# Altium footprint library con-samtec.PCBLIB: 805 footprints (part 2 of 55)
Each footprint in its own frame and in the unit in brackets; x right, y up, seen from the top. Pads: shape width x height; smd on the part's side, far side on the other; paste and mask are expansions set on the pad; w line width, h text height; cw(c..) or ccw(c..) is an arc to the next point about the centre after c.
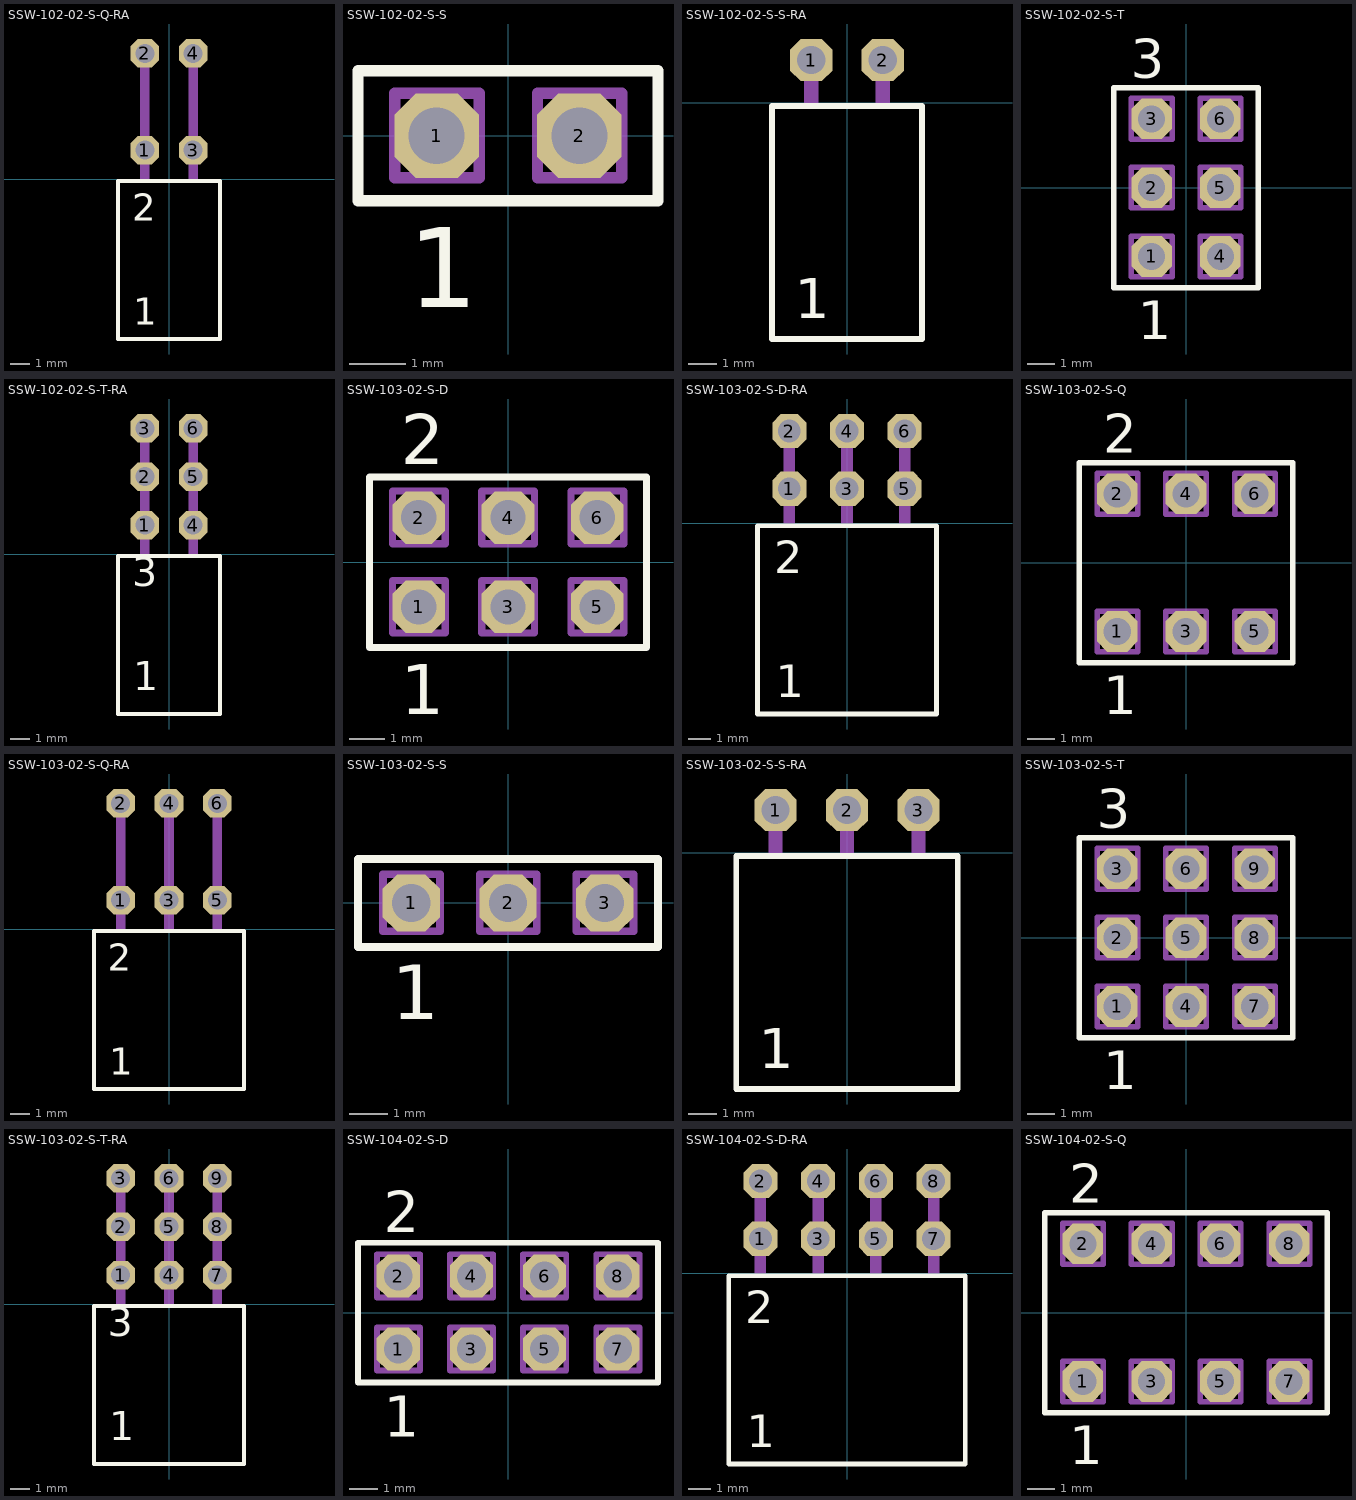
[diagram p1: the footprints below, top view; thin cyan lines are the x and y axes]

## SSW-102-02-S-Q-RA [mil]
pads (4):
  oct 59.06x59.06 hole 39.37: 1(-50,60) 2(-50,260) 3(50,60) 4(50,260)
Top Overlay:
  lines w8: -105.08,-330.55 105.08,-330.55 105.08,-4.17 -105.08,-4.17 -105.08,-330.55
  text "1" at -73.43,-301.18 h56.1
  text "2" at -76.38,-86.61 h56.1
Mechanical 16:
  rectangle: -60,0 -40,270
  rectangle: 40,0 60,270

## SSW-102-02-S-S [mm]
pads (2):
  oct 1.5x1.5 hole 1: 1(-1.27,0) 2(1.27,0)
Top Overlay:
  lines w0.203: -2.669,-1.155 2.669,-1.155 2.669,1.155 -2.669,1.155 -2.669,-1.155
  text "1" at -1.778,-3.048 h1.42
Mechanical 16:
  lines w0.203: -2.015,-0.745 -0.515,-0.745 -0.515,0.755 -2.015,0.755 -2.015,-0.745 ; 0.525,-0.745 2.025,-0.745 2.025,0.755 0.525,0.755 0.525,-0.745

## SSW-102-02-S-S-RA [mil]
pads (2):
  oct 59.06x59.06 hole 39.37: 1(-50,60) 2(50,60)
Top Overlay:
  lines w8: -105.08,-330.55 105.08,-330.55 105.08,-4.17 -105.08,-4.17 -105.08,-330.55
  text "1" at -73.43,-301.18 h56.1
Mechanical 16:
  rectangle: -60,0 -40,70
  rectangle: 40,0 60,70

## SSW-102-02-S-T [mm]
pads (6):
  oct 1.5x1.5 hole 1: 1(-1.27,-2.54) 2(-1.27,0) 3(-1.27,2.54) 4(1.27,-2.54) 5(1.27,0) 6(1.27,2.54)
Top Overlay:
  lines w0.203: -2.669,-3.695 2.669,-3.695 2.669,3.695 -2.669,3.695 -2.669,-3.695
  text "1" at -1.778,-5.588 h1.42
  text "3" at -2.032,4.064 h1.42
Mechanical 16:
  lines w0.203: -2.015,-3.285 -0.515,-3.285 -0.515,-1.785 -2.015,-1.785 -2.015,-3.285 ; -2.015,-0.745 -0.515,-0.745 -0.515,0.755 -2.015,0.755 -2.015,-0.745 ; -2.015,1.795 -0.515,1.795 -0.515,3.295 -2.015,3.295 -2.015,1.795 ; 0.525,-3.285 2.025,-3.285 2.025,-1.785 0.525,-1.785 0.525,-3.285 ; 0.525,-0.745 2.025,-0.745 2.025,0.755 0.525,0.755 0.525,-0.745 ; 0.525,1.795 2.025,1.795 2.025,3.295 0.525,3.295 0.525,1.795

## SSW-102-02-S-T-RA [mil]
pads (6):
  oct 59.06x59.06 hole 39.37: 1(-50,60) 2(-50,160) 3(-50,260) 4(50,60) 5(50,160) 6(50,260)
Top Overlay:
  lines w8: -105.08,-330.55 105.08,-330.55 105.08,-4.17 -105.08,-4.17 -105.08,-330.55
  text "1" at -73.43,-301.18 h102.3
  text "3" at -76.38,-86.61 h102.3
Mechanical 16:
  rectangle: -60,0 -40,270
  rectangle: 40,0 60,270

## SSW-103-02-S-D [mm]
pads (6):
  oct 1.5x1.5 hole 1: 1(-2.54,-1.27) 2(-2.54,1.27) 3(0,-1.27) 4(0,1.27) 5(2.54,-1.27) 6(2.54,1.27)
Top Overlay:
  lines w0.203: -3.939,-2.425 3.939,-2.425 3.939,2.425 -3.939,2.425 -3.939,-2.425
  text "1" at -3.048,-4.318 h1.42
  text "2" at -3.048,2.794 h1.42
Mechanical 16:
  lines w0.203: -3.285,-2.015 -1.785,-2.015 -1.785,-0.515 -3.285,-0.515 -3.285,-2.015 ; -3.285,0.525 -1.785,0.525 -1.785,2.025 -3.285,2.025 -3.285,0.525 ; -0.745,-2.015 0.755,-2.015 0.755,-0.515 -0.745,-0.515 -0.745,-2.015 ; -0.745,0.525 0.755,0.525 0.755,2.025 -0.745,2.025 -0.745,0.525 ; 1.795,-2.015 3.295,-2.015 3.295,-0.515 1.795,-0.515 1.795,-2.015 ; 1.795,0.525 3.295,0.525 3.295,2.025 1.795,2.025 1.795,0.525

## SSW-103-02-S-D-RA [mil]
pads (6):
  oct 59.06x59.06 hole 39.37: 1(-100,60) 2(-100,160) 3(0,60) 4(0,160) 5(100,60) 6(100,160)
Top Overlay:
  lines w8: -155.08,-330.55 155.08,-330.55 155.08,-4.17 -155.08,-4.17 -155.08,-330.55
  text "1" at -123.43,-301.18 h56.1
  text "2" at -126.38,-86.61 h56.1
Mechanical 16:
  rectangle: -110,0 -90,170
  rectangle: -10,0 10,170
  rectangle: 90,0 110,170

## SSW-103-02-S-Q [mm]
pads (6):
  oct 1.5x1.5 hole 1: 1(-2.54,-2.54) 2(-2.54,2.54) 3(0,-2.54) 4(0,2.54) 5(2.54,-2.54) 6(2.54,2.54)
Top Overlay:
  lines w0.203: -3.939,-3.695 3.939,-3.695 3.939,3.695 -3.939,3.695 -3.939,-3.695
  text "1" at -3.048,-5.588 h1.42
  text "2" at -3.048,4.064 h1.42
Mechanical 16:
  lines w0.203: -3.285,-3.285 -1.785,-3.285 -1.785,-1.785 -3.285,-1.785 -3.285,-3.285 ; -3.285,1.795 -1.785,1.795 -1.785,3.295 -3.285,3.295 -3.285,1.795 ; -0.745,-3.285 0.755,-3.285 0.755,-1.785 -0.745,-1.785 -0.745,-3.285 ; -0.745,1.795 0.755,1.795 0.755,3.295 -0.745,3.295 -0.745,1.795 ; 1.795,-3.285 3.295,-3.285 3.295,-1.785 1.795,-1.785 1.795,-3.285 ; 1.795,1.795 3.295,1.795 3.295,3.295 1.795,3.295 1.795,1.795

## SSW-103-02-S-Q-RA [mil]
pads (6):
  oct 59.06x59.06 hole 39.37: 1(-100,60) 2(-100,260) 3(0,60) 4(0,260) 5(100,60) 6(100,260)
Top Overlay:
  lines w8: -155.08,-330.55 155.08,-330.55 155.08,-4.17 -155.08,-4.17 -155.08,-330.55
  text "1" at -123.43,-301.18 h56.1
  text "2" at -126.38,-86.61 h56.1
Mechanical 16:
  rectangle: -110,0 -90,270
  rectangle: -10,0 10,270
  rectangle: 90,0 110,270

## SSW-103-02-S-S [mm]
pads (3):
  oct 1.5x1.5 hole 1: 1(-2.54,0) 2(0,0) 3(2.54,0)
Top Overlay:
  lines w0.203: -3.939,-1.155 3.939,-1.155 3.939,1.155 -3.939,1.155 -3.939,-1.155
  text "1" at -3.048,-3.048 h1.42
Mechanical 16:
  lines w0.203: -3.285,-0.745 -1.785,-0.745 -1.785,0.755 -3.285,0.755 -3.285,-0.745 ; -0.745,-0.745 0.755,-0.745 0.755,0.755 -0.745,0.755 -0.745,-0.745 ; 1.795,-0.745 3.295,-0.745 3.295,0.755 1.795,0.755 1.795,-0.745

## SSW-103-02-S-S-RA [mil]
pads (3):
  oct 59.06x59.06 hole 39.37: 1(-100,60) 2(0,60) 3(100,60)
Top Overlay:
  lines w8: -155.08,-330.55 155.08,-330.55 155.08,-4.17 -155.08,-4.17 -155.08,-330.55
  text "1" at -123.43,-301.18 h56.1
Mechanical 16:
  rectangle: -110,0 -90,70
  rectangle: -10,0 10,70
  rectangle: 90,0 110,70

## SSW-103-02-S-T [mm]
pads (9):
  oct 1.5x1.5 hole 1: 1(-2.54,-2.54) 2(-2.54,0) 3(-2.54,2.54) 4(0,-2.54) 5(0,0) 6(0,2.54) 7(2.54,-2.54) 8(2.54,0) 9(2.54,2.54)
Top Overlay:
  lines w0.203: -3.939,-3.695 3.939,-3.695 3.939,3.695 -3.939,3.695 -3.939,-3.695
  text "1" at -3.048,-5.588 h1.42
  text "3" at -3.302,4.064 h1.42
Mechanical 16:
  lines w0.203: -3.285,-3.285 -1.785,-3.285 -1.785,-1.785 -3.285,-1.785 -3.285,-3.285 ; -3.285,-0.745 -1.785,-0.745 -1.785,0.755 -3.285,0.755 -3.285,-0.745 ; -3.285,1.795 -1.785,1.795 -1.785,3.295 -3.285,3.295 -3.285,1.795 ; -0.745,-3.285 0.755,-3.285 0.755,-1.785 -0.745,-1.785 -0.745,-3.285 ; -0.745,-0.745 0.755,-0.745 0.755,0.755 -0.745,0.755 -0.745,-0.745 ; -0.745,1.795 0.755,1.795 0.755,3.295 -0.745,3.295 -0.745,1.795 ; 1.795,-3.285 3.295,-3.285 3.295,-1.785 1.795,-1.785 1.795,-3.285 ; 1.795,-0.745 3.295,-0.745 3.295,0.755 1.795,0.755 1.795,-0.745 ; 1.795,1.795 3.295,1.795 3.295,3.295 1.795,3.295 1.795,1.795

## SSW-103-02-S-T-RA [mil]
pads (9):
  oct 59.06x59.06 hole 39.37: 1(-100,60) 2(-100,160) 3(-100,260) 4(0,60) 5(0,160) 6(0,260) 7(100,60) 8(100,160) 9(100,260)
Top Overlay:
  lines w8: -155.08,-330.55 155.08,-330.55 155.08,-4.17 -155.08,-4.17 -155.08,-330.55
  text "1" at -123.43,-301.18 h102.3
  text "3" at -126.38,-86.61 h102.3
Mechanical 16:
  rectangle: -110,0 -90,270
  rectangle: -10,0 10,270
  rectangle: 90,0 110,270

## SSW-104-02-S-D [mm]
pads (8):
  oct 1.5x1.5 hole 1: 1(-3.81,-1.27) 2(-3.81,1.27) 3(-1.27,-1.27) 4(-1.27,1.27) 5(1.27,-1.27) 6(1.27,1.27) 7(3.81,-1.27) 8(3.81,1.27)
Top Overlay:
  lines w0.203: -5.209,-2.425 5.209,-2.425 5.209,2.425 -5.209,2.425 -5.209,-2.425
  text "1" at -4.318,-4.318 h1.42
  text "2" at -4.318,2.794 h1.42
Mechanical 16:
  lines w0.203: -4.555,-2.015 -3.055,-2.015 -3.055,-0.515 -4.555,-0.515 -4.555,-2.015 ; -4.555,0.525 -3.055,0.525 -3.055,2.025 -4.555,2.025 -4.555,0.525 ; -2.015,-2.015 -0.515,-2.015 -0.515,-0.515 -2.015,-0.515 -2.015,-2.015 ; -2.015,0.525 -0.515,0.525 -0.515,2.025 -2.015,2.025 -2.015,0.525 ; 0.525,-2.015 2.025,-2.015 2.025,-0.515 0.525,-0.515 0.525,-2.015 ; 0.525,0.525 2.025,0.525 2.025,2.025 0.525,2.025 0.525,0.525 ; 3.065,-2.015 4.565,-2.015 4.565,-0.515 3.065,-0.515 3.065,-2.015 ; 3.065,0.525 4.565,0.525 4.565,2.025 3.065,2.025 3.065,0.525

## SSW-104-02-S-D-RA [mil]
pads (8):
  oct 59.06x59.06 hole 39.37: 1(-150,60) 2(-150,160) 3(-50,60) 4(-50,160) 5(50,60) 6(50,160) 7(150,60) 8(150,160)
Top Overlay:
  lines w8: -205.08,-330.55 205.08,-330.55 205.08,-4.17 -205.08,-4.17 -205.08,-330.55
  text "1" at -173.43,-301.18 h56.1
  text "2" at -176.38,-86.61 h56.1
Mechanical 16:
  rectangle: -160,0 -140,170
  rectangle: -60,0 -40,170
  rectangle: 40,0 60,170
  rectangle: 140,0 160,170

## SSW-104-02-S-Q [mm]
pads (8):
  oct 1.5x1.5 hole 1: 1(-3.81,-2.54) 2(-3.81,2.54) 3(-1.27,-2.54) 4(-1.27,2.54) 5(1.27,-2.54) 6(1.27,2.54) 7(3.81,-2.54) 8(3.81,2.54)
Top Overlay:
  lines w0.203: -5.209,-3.695 5.209,-3.695 5.209,3.695 -5.209,3.695 -5.209,-3.695
  text "1" at -4.318,-5.588 h1.42
  text "2" at -4.318,4.064 h1.42
Mechanical 16:
  lines w0.203: -4.555,-3.285 -3.055,-3.285 -3.055,-1.785 -4.555,-1.785 -4.555,-3.285 ; -4.555,1.795 -3.055,1.795 -3.055,3.295 -4.555,3.295 -4.555,1.795 ; -2.015,-3.285 -0.515,-3.285 -0.515,-1.785 -2.015,-1.785 -2.015,-3.285 ; -2.015,1.795 -0.515,1.795 -0.515,3.295 -2.015,3.295 -2.015,1.795 ; 0.525,-3.285 2.025,-3.285 2.025,-1.785 0.525,-1.785 0.525,-3.285 ; 0.525,1.795 2.025,1.795 2.025,3.295 0.525,3.295 0.525,1.795 ; 3.065,-3.285 4.565,-3.285 4.565,-1.785 3.065,-1.785 3.065,-3.285 ; 3.065,1.795 4.565,1.795 4.565,3.295 3.065,3.295 3.065,1.795